# Altium footprint library Dr.Xiong_20160818.PcbLib: 266 footprints (part 4 of 17)
Each footprint in its own frame and in the unit in brackets; x right, y up, seen from the top. Pads: shape width x height; smd on the part's side, far side on the other; paste and mask are expansions set on the pad; w line width, h text height; cw(c..) or ccw(c..) is an arc to the next point about the centre after c.
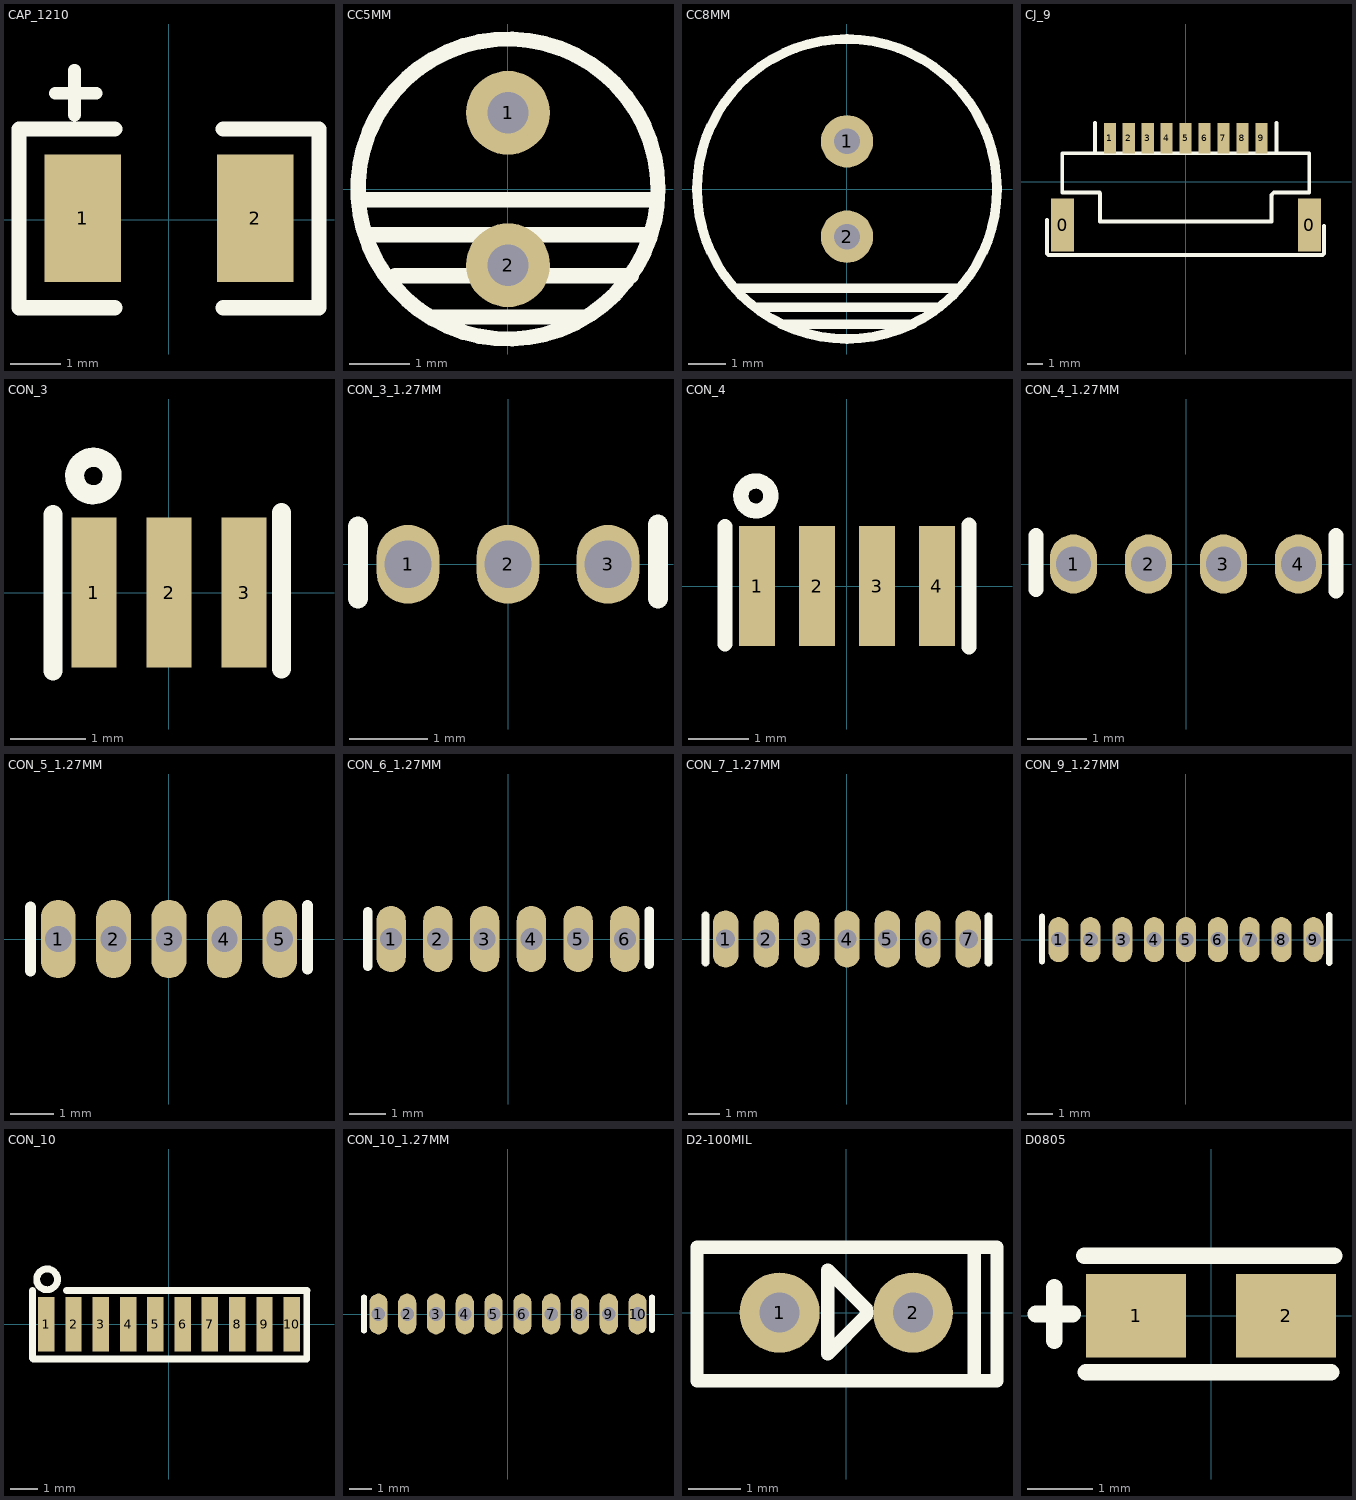
[diagram p3: the footprints below, top view; thin cyan lines are the x and y axes]

## CAP_1210 [mil]
pads (2):
  rect 60x100 smd: 1(-67.5,1) 2(67.5,1)
Top Overlay:
  lines w10: -89,99 -57,99 ; -74,82 -74,117
  lines w12: -42.5,-69 -117.5,-69 -117.5,71 -42.5,71 ; 42.5,-69 117.5,-69 117.5,71 42.5,71

## CC5MM [mil]
pads (2):
  round 55 hole 27: 1(0,50) 2(0,-50)
Top Overlay:
  circle w10: c0,0 r98.43
  lines w10: -97,-7 96,-7 97,-6 ; -93,-30 -37,-30 ; -77,-60 -74,-57 40,-57 81,-57 ; -50,-84 50,-84 ; -40,-30 36,-30 93,-30

## CC8MM [mil]
pads (2):
  round 55 hole 27: 1(0,50) 2(0,-50)
Top Overlay:
  circle w10: c0,0 r157.48
  lines w10: -117,-104 117,-104 ; -94,-124 97,-124 98,-123 ; -69,-142 69,-142 70,-141

## CJ_9 [mm]
pads (11):
  rect 1.5x3.5 smd: 0(-8.15,-2.866) 0(8.15,-2.866)
  rect 0.8x2 smd: 1(-5.025,2.866) 2(-3.775,2.866) 3(-2.525,2.866) 4(-1.275,2.866) 5(-0.025,2.866) 6(1.225,2.866) 7(2.475,2.866) 8(3.725,2.866) 9(4.975,2.866)
Top Overlay:
  lines w0.254: -9.169,-2.54 -9.169,-4.75 -9.068,-4.851 9.017,-4.851 9.119,-4.75 9.119,-2.921 ; -6.016,1.875 -6.016,3.875 ; 5.984,1.875 5.984,3.875 ; -8.166,-0.725 -8.166,1.875 8.134,1.875 8.134,-0.725 5.794,-0.725 5.634,-0.886 5.634,-2.625 -5.666,-2.625 -5.666,-0.77 -5.712,-0.725 -8.166,-0.725

## CON_3 [mm]
pads (3):
  rect 0.6x2 smd: 1(-1,0) 2(0,0) 3(1,0)
Top Overlay:
  lines w0.254: -1.549,-1.041 -1.549,1.041 ; -0.762,1.6 ccw(c-1.008,1.555) -0.759,1.578 ; 1.499,-1.016 1.499,1.067

## CON_3_1.27MM [mm]
pads (3):
  oval 0.8x1 hole 0.6: 1(-1.27,0) 2(0,0) 3(1.27,0)
Top Overlay:
  lines w0.254: -1.905,-0.432 -1.905,0.483 ; 1.905,-0.432 1.905,0.508

## CON_4 [mm]
pads (4):
  rect 0.6x2 smd: 1(-1.5,0) 2(-0.5,0) 3(0.5,0) 4(1.5,0)
Top Overlay:
  lines w0.254: -2.032,-0.965 -2.032,0.991 ; -1.273,1.546 ccw(c-1.519,1.501) -1.27,1.524 ; 2.032,-1.016 2.032,1.016

## CON_4_1.27MM [mm]
pads (4):
  oval 0.8x1 hole 0.6: 1(-1.905,0) 2(-0.635,0) 3(0.635,0) 4(1.905,0)
Top Overlay:
  lines w0.254: -2.54,-0.432 -2.54,0.483 ; 2.54,-0.457 2.54,0.483

## CON_5_1.27MM [mm]
pads (5):
  oval 0.8x1.8 hole 0.6: 1(-2.54,0) 2(-1.27,0) 3(0,0) 4(1.27,0) 5(2.54,0)
Top Overlay:
  lines w0.254: -3.175,-0.737 -3.175,0.737 ; 3.175,-0.686 3.175,0.762

## CON_6_1.27MM [mm]
pads (6):
  oval 0.8x1.8 hole 0.6: 1(-3.175,0) 2(-1.905,0) 3(-0.635,0) 4(0.635,0) 5(1.905,0) 6(3.175,0)
Top Overlay:
  lines w0.254: -3.81,-0.737 -3.81,0.737 ; 3.835,-0.686 3.835,0.762

## CON_7_1.27MM [mm]
pads (7):
  oval 0.8x1.8 hole 0.6: 1(-3.81,0) 2(-2.54,0) 3(-1.27,0) 4(0,0) 5(1.27,0) 6(2.54,0) 7(3.81,0)
Top Overlay:
  lines w0.254: -4.445,-0.737 -4.445,0.737 ; 4.445,-0.737 4.445,0.711

## CON_9_1.27MM [mm]
pads (9):
  oval 0.8x1.8 hole 0.6: 1(-5.08,0) 2(-3.81,0) 3(-2.54,0) 4(-1.27,0) 5(0,0) 6(1.27,0) 7(2.54,0) 8(3.81,0) 9(5.08,0)
Top Overlay:
  lines w0.254: -5.74,-0.864 -5.74,0.914 ; 5.715,-0.914 5.715,0.965

## CON_10 [mm]
pads (10):
  rect 0.6x2 smd: 1(-4.5,0) 2(-3.5,0) 3(-2.5,0) 4(-1.5,0) 5(-0.5,0) 6(0.5,0) 7(1.5,0) 8(2.5,0) 9(3.5,0) 10(4.5,0)
Top Overlay:
  circle w0.254: c-4.47,1.651 r0.381
  lines w0.254: -5.008,1.245 -5.008,-1.241 -4.978,-1.27 5.051,-1.27 5.051,1.198 ; -3.759,1.245 5.055,1.245

## CON_10_1.27MM [mm]
pads (10):
  oval 0.8x1.8 hole 0.6: 1(-5.715,0) 2(-4.445,0) 3(-3.175,0) 4(-1.905,0) 5(-0.635,0) 6(0.635,0) 7(1.905,0) 8(3.175,0) 9(4.445,0) 10(5.715,0)
Top Overlay:
  lines w0.254: -6.35,-0.737 -6.35,0.737 ; 6.35,-0.711 6.35,0.737

## D2-100MIL [mil]
pads (2):
  round 60 hole 30: 1(-50,0) 2(50,0)
Top Overlay:
  lines w10: -112,9 -112,11 ; 95,-51 96,-50 96,49 ; 105,49 -112,49 -112,-51 113,-51 113,41 ; 106,49 113,49 113,39 ; -14,-31 15,-2 15,1 15,3 -14,32 -14,-31

## D0805 [mil]
pads (2):
  rect 60x50 smd: 1(-45,0) 2(45,0)
Top Overlay:
  lines w10: -105,1 -83,1 ; -94,-15 -94,17 ; -76,36 74,36 ; -75,-34 72,-34